# Altium footprint library THU.PcbLib: 477 footprints (part 10 of 30)
Each footprint in its own frame and in the unit in brackets; x right, y up, seen from the top. Pads: shape width x height; smd on the part's side, far side on the other; paste and mask are expansions set on the pad; w line width, h text height; cw(c..) or ccw(c..) is an arc to the next point about the centre after c.
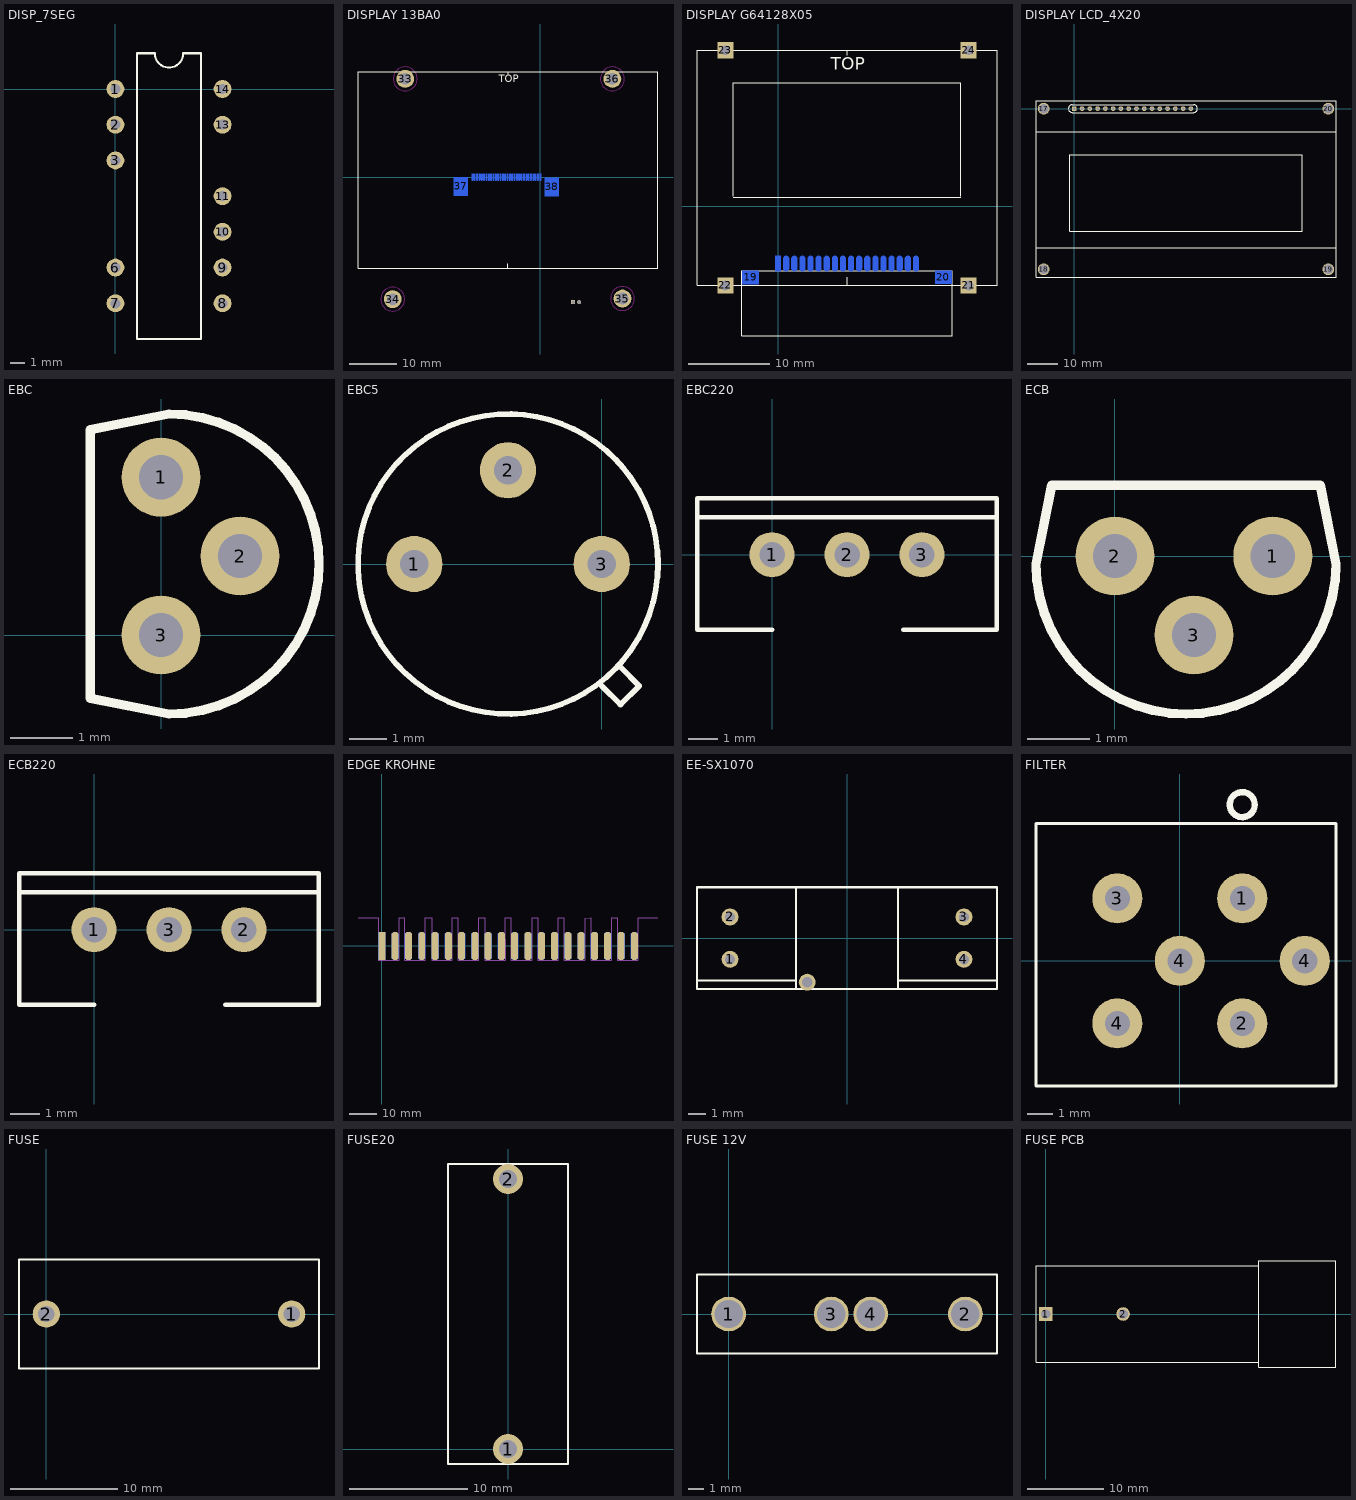
[diagram p9: the footprints below, top view; thin cyan lines are the x and y axes]

## DISP_7SEG [mil]
pads (11):
  round 50 hole 28: 1(0,0) 2(0,-100) 3(0,-200) 6(0,-500) 7(0,-600) 8(300,-600) 9(300,-500) 10(300,-400) 11(300,-300) 13(300,-100) 14(300,0)
TopOverlay:
  lines w6: 60,-700 60,100 110,100 ccw(c150,100) 190,100 240,100 240,-700 60,-700

## DISPLAY 13BA0 [mm]
pads (38):
  rect 0.33x1.5 smd far side: 1(0,0)
  oval 0.33x1.5 smd far side: 2(-0.5,0) 3(-1,0) 4(-1.5,0) 5(-2,0) 6(-2.5,0) 7(-3,0) 8(-3.5,0) 9(-4,0) 10(-4.5,0) 11(-5,0) 12(-5.5,0) 13(-6,0) 14(-6.5,0) 15(-7,0) 16(-7.5,0) 17(-8,0) 18(-8.5,0) 19(-9,0) 20(-9.5,0) 21(-10,0) 22(-10.5,0) 23(-11,0) 24(-11.5,0) 25(-12,0) 26(-12.5,0) 27(-13,0) 28(-13.5,0) 29(-14,0) 30(-14.5,0)
  round 0.864 hole 0.711: 31(8.285,-26.67)
  rect 0.864x0.864 hole 0.711: 32(6.985,-26.67)
  round 3.81 hole 2.5: 33(-28.829,20.955) 34(-31.496,-26.035) 35(17.526,-25.908) 36(15.367,20.955)
  rect 3x4 smd far side: 37(-17,-2) 38(2.4,-2.1)
TopOverlay:
  lines w0.152: -7,-19.5 -7,-18.5 ; -6.9,21.9 -6.9,22.5 ; -38.9,-19.5 -38.9,22.5 25.1,22.5 25.1,-19.5 -38.9,-19.5
  text "TOP" at -8.89,20.193 h1.52
BottomOverlay:
  lines w0.152: -16.2,-4.2 -16.2,-5 2.4,-5 2.4,-4.2 ; -15.6,0 -14.1,0 ; -6.9,-5 -6.9,-4.1 ; 0.3,0 1.7,0 ; 6.5,-22.2 5.6,-22.2 5.6,-25.1 10.1,-25.1 10.1,-22.2 9.1,-22.2
KeepOutLayer:
  circle w0.152: c-28.829,20.955 r2.553
  circle w0.152: c15.367,20.955 r2.553
  circle w0.152: c-31.496,-26.035 r2.553
  circle w0.152: c17.526,-25.908 r2.553

## DISPLAY G64128X05 [mm]
pads (24):
  rect 0.7x1.9 smd far side: 1(0,-7.1)
  oval 0.7x1.9 smd far side: 2(1,-7.1) 3(2,-7.1) 4(3,-7.1) 5(4,-7.1) 6(5,-7.1) 7(6,-7.1) 8(7,-7.1) 9(8,-7.1) 10(9,-7.1) 11(10,-7.1) 12(11,-7.1) 13(12,-7.1) 14(13,-7.1) 15(14,-7.1) 16(15,-7.1) 17(16,-7.1) 18(17,-7.1)
  rect 2x1.65 smd far side: 19(-3.4,-8.8)
  rect 2x1.6 smd far side: 20(20.4,-8.8)
  rect 2x2 hole 1.2: 21(23.5,-9.8) 22(-6.5,-9.8) 23(-6.5,19.2) 24(23.5,19.2)
TopOverlay:
  lines w0.152: -5.5,1.1 22.5,1.1 ; -5.5,1.2 -5.5,15.2 22.5,15.2 22.5,1.2 ; 8.5,-9.8 8.5,-8.8 ; 8.5,18.6 8.5,19.2 ; -10,-9.8 27,-9.8 27,19.2 -10,19.2 -10,-9.8 ; -4.5,-16 -4.5,-8 21.5,-8 21.5,-16 -4.5,-16
  text "TOP" at 6.5,16.8 h1.52

## DISPLAY LCD_4X20 [mil]
pads (20):
  rect 60x60 hole 34: 1(0,0)
  round 60 hole 34: 2(100,0) 3(200,0) 4(300,0) 5(400,0) 6(500,0) 7(600,0) 8(700,0) 9(800,0) 10(900,0) 11(1000,0) 12(1100,0) 13(1200,0) 14(1300,0) 15(1400,0) 16(1500,0)
  round 150 hole 125: 17(-393.7,0) 18(-393.7,-2066.93) 19(3267.72,-2066.93) 20(3267.72,0)
TopOverlay:
  lines w6: -492.13,-1791.34 3366.14,-1791.34 ; -492.13,-295.28 3366.14,-295.28 ; -492.13,-2165.35 3366.14,-2165.35 3366.14,98.42 -492.13,98.42 -492.13,-2165.35 ; -59.05,-1574.8 2933.07,-1574.8 2933.07,-590.55 -59.05,-590.55 -59.05,-1574.8 ; -25,-50 cw(c-25,0) -25,50 1535,50 cw(c1535,0) 1535,-50 -25,-50

## EBC [mil]
pads (3):
  round 50 hole 28: 1(0,100) 2(50,50) 3(0,0)
TopOverlay:
  lines w6: -45,-40 -45,130 5,140 cw(c5,45) 5,-50 -45,-40

## EBC5 [mil]
pads (3):
  round 60 hole 30: 1(-200,0) 2(-100,100) 3(0,0)
TopOverlay:
  circle w6: c-100,0 r160
  lines w6: 0,-130 20,-150 40,-130 20,-110

## EBC220 [mil]
pads (3):
  round 60 hole 34: 1(0,0) 2(100,0) 3(200,0)
TopOverlay:
  lines w6: 0,-100 -100,-100 -100,50 ; 150,50 175,50 ; 175,-100 300,-100 300,50 ; -100,50 -100,75 300,75 300,50 ; -100,50 300,50

## ECB [mil]
pads (3):
  round 50 hole 28: 1(100,0) 2(0,0) 3(50,-50)
TopOverlay:
  lines w6: -50,-5 ccw(c45,-5) 140,-5 130,45 -40,45 -50,-5

## ECB220 [mil]
pads (3):
  round 60 hole 34: 1(0,0) 2(200,0) 3(100,0)
TopOverlay:
  lines w6: 0,-100 -100,-100 -100,50 ; 150,50 175,50 ; 175,-100 300,-100 300,50 ; -100,50 300,50 ; -100,50 -100,75 300,75 300,50

## EDGE KROHNE [mm]
pads (40):
  rect 2.5x10 smd: 1(0,0)
  oct 2.5x10 smd: 2(4.76,0) 3(9.52,0) 4(14.28,0) 5(19.04,0) 6(23.8,0) 7(28.56,0) 8(33.32,0) 9(38.08,0) 10(42.84,0) 11(47.6,0) 12(52.36,0) 13(57.12,0) 14(61.88,0) 15(66.64,0) 16(71.4,0) 17(76.16,0) 18(80.92,0) 19(85.68,0) 20(90.44,0)
  rect 2.5x10 smd far side: 21(0,0)
  oct 2.5x10 smd far side: 22(4.76,0) 23(9.52,0) 24(14.28,0) 25(19.04,0) 26(23.8,0) 27(28.56,0) 28(33.32,0) 29(38.08,0) 30(42.84,0) 31(47.6,0) 32(52.36,0) 33(57.12,0) 34(61.88,0) 35(66.64,0) 36(71.4,0) 37(76.16,0) 38(80.92,0) 39(85.68,0) 40(90.44,0)
Mechanical3:
  lines w0.152: -8.56,10.084 -8.534,10.058 -1.295,10.058 -1.27,-5.08 1.295,-5.08 3.505,-5.08 6.071,-5.08 6.045,10.033 8.28,10.033 8.28,-5.08 10.846,-5.08 13.056,-5.08 15.621,-5.08 15.621,10.033 17.78,10.033 17.831,-5.08 20.295,-5.08 22.504,-5.08 25.07,-5.08 25.044,10.033 27.305,10.033 27.28,-5.08 29.845,-5.08 32.055,-5.08 34.62,-5.08 34.62,10.033 36.779,10.033 36.83,-5.08 39.345,-5.08 41.554,-5.08 44.12,-5.08 44.094,10.033 46.33,10.033 46.33,-5.08 48.895,-5.08 51.105,-5.08 53.67,-5.08 53.645,10.033 55.855,10.033 55.88,-5.08 58.42,-5.08 60.63,-5.08 63.144,-5.08 63.144,10.033 65.354,10.033 65.303,-5.08 67.97,-5.08 70.18,-5.08 72.746,-5.08 72.72,10.008 74.955,10.033 74.955,-5.08 77.419,-5.08 79.629,-5.08 82.194,-5.08 82.169,10.033 84.379,10.033 84.404,-5.08 86.97,-5.08 89.179,-5.08 91.745,-5.08 91.719,10.033 98.933,10.033

## EE-SX1070 [mm] "OMRON OPTICAL SENSOR"
height 10
pads (5):
  round 1 hole 0.6: 1(-6.9,-1.25) 2(-6.9,1.25) 3(6.9,1.25) 4(6.9,-1.25) ""(-2.35,-2.6)
TopOverlay:
  lines w0.127: -8.85,-2.5 -3,-2.5 ; -3,-3 -3,3 ; 3,-3 3,3 ; 3,-2.5 8.85,-2.5 ; -8.85,-3 -8.85,3 8.85,3 8.85,-3 -8.85,-3
3D body "EE_SX1070.step": height 10, standoff -6.2, extent -8.85,-3 8.85,3

## FILTER [mm] "BNX00x"
height 0.33
pads (6):
  round 2 hole 1: 1(2.5,2.5) 2(2.5,-2.5) 3(-2.5,2.5) 4(-2.5,-2.5) 4(0,0) 4(5,0)
TopOverlay:
  circle w0.254: c2.5,6.25 r0.5
  lines w0.127: -5.75,-5 6.25,-5 6.25,5.5 -5.75,5.5 -5.75,-5
3D body: height 12, standoff 0, extent -5.75,-5 6.25,5.5
3D body: height 13, standoff 12, extent -3.375,-2.25 3.375,2.25

## FUSE [mil]
pads (2):
  round 100 hole 59: 1(900,0) 2(0,0)
TopOverlay:
  lines w6: -100,-200 -100,200 1000,200 1000,-200 -100,-200

## FUSE20 [mil]
pads (2):
  round 100 hole 59: 1(0,0) 2(0,900)
TopOverlay:
  lines w6: -200,-50 -200,950 200,950 200,-50 -200,-50

## FUSE 12V [mm]
pads (4):
  round 2.2 hole 1.8: 1(0,0) 2(15,0) 3(6.5,0) 4(9,0)
TopOverlay:
  lines w0.152: -2,-2.5 -2,0 -2,2.5 17,2.5 17,-2.5 -2,-2.5

## FUSE PCB [mil]
pads (2):
  rect 70x70 hole 49: 1(0,0)
  round 70 hole 49: 2(400,0)
TopOverlay:
  lines w6: 1100,-250 1100,-275 1500,-275 1500,275 1100,275 1100,250 ; 1100,-250 1100,250 ; 1100,-250 -50,-250 -50,0 -50,250 1100,250